# Altium footprint library 3.11-micro USB 、3.1 Type C接口.PcbLib: 28 footprints (part 1 of 2)
Each footprint in its own frame and in the unit in brackets; x right, y up, seen from the top. Pads: shape width x height; smd on the part's side, far side on the other; paste and mask are expansions set on the pad; w line width, h text height; cw(c..) or ccw(c..) is an arc to the next point about the centre after c.
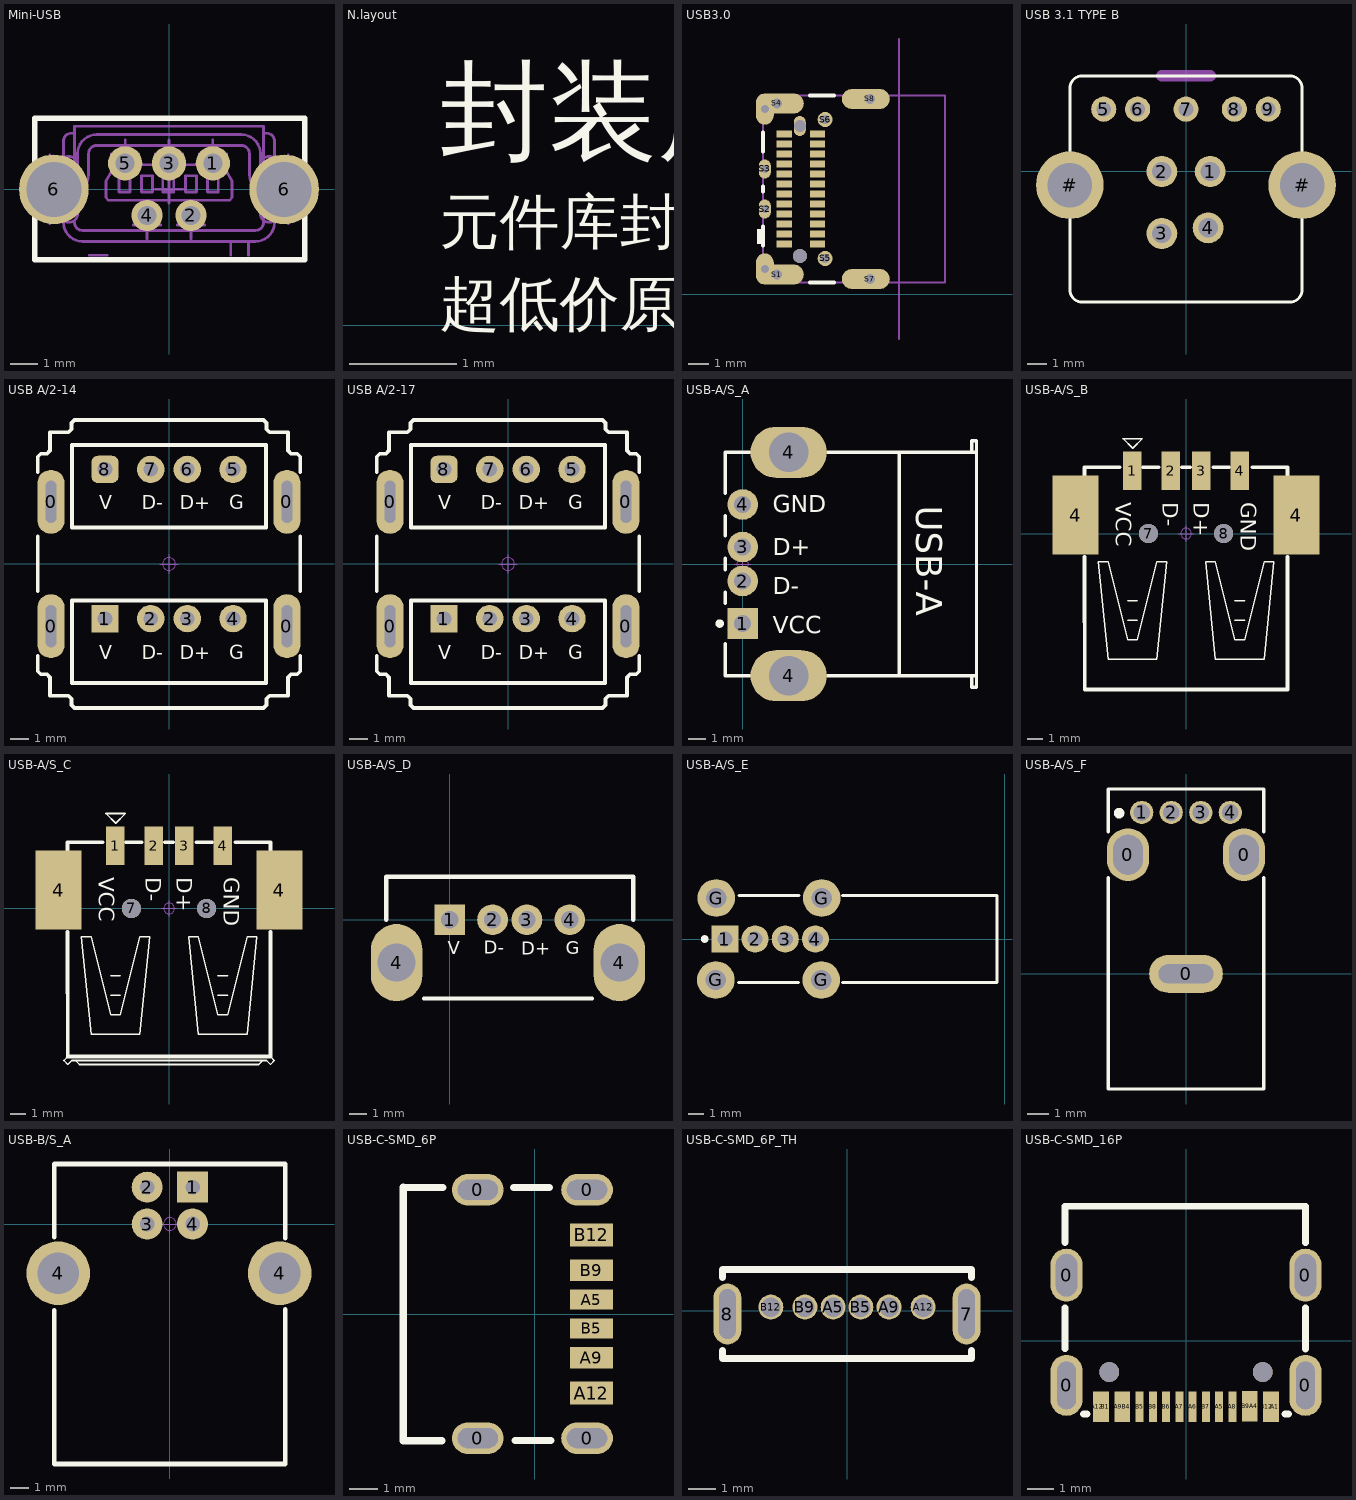
[diagram p0: the footprints below, top view; thin cyan lines are the x and y axes]

## Mini-USB [mm] "Straight, USB Serie Mini-B Type 2 Through Hole Receptacle"
height 7.7
pads (7):
  round 1.25 hole 0.7: 1(1.6,0.95) 3(0,0.95) 5(-1.6,0.95)
  round 1.143 hole 0.7: 2(0.8,-0.95) 4(-0.8,-0.95)
  round 2.54 hole 2.007: 6(-4.2,0) 6(4.2,0)
Top Overlay:
  lines w0.2: 1.4,0.5 1.8,0.5 ; -4.902,-2.565 -4.902,2.591 -3.031,2.591 4.953,2.591 4.953,-2.565 -4.902,-2.565
Mechanical 8:
  lines w0.1: -4.35,-1.25 -4.35,1.25 ; -4.15,0 -3.65,0 ; -3.65,-0.5 -3.65,0 ; -3.65,0.5 -3.65,0 ; -3.15,0 -3.65,0 ; -2.1,1.3 -1.6,1.3 ; -1.6,0.8 -1.6,1.3 ; -1.6,1.8 -1.6,1.3 ; -1.3,-1.3 -0.8,-1.3 ; -1.1,1.3 -1.6,1.3 ; -0.8,-1.8 -0.8,-1.3 ; -0.8,-0.8 -0.8,-1.3 ; -0.5,0 0,0 ; -0.5,1.3 0,1.3 ; -0.3,-1.3 -0.8,-1.3 ; 0,-0.5 0,0 ; 0,0.5 0,0 ; 0,0.8 0,1.3 ; 0,1.8 0,1.3 ; 0.3,-1.3 0.8,-1.3 ; 0.5,0 0,0 ; 0.5,1.3 0,1.3 ; 0.8,-1.8 0.8,-1.3 ; 0.8,-0.8 0.8,-1.3 ; 1.1,1.3 1.6,1.3 ; 1.3,-1.3 0.8,-1.3 ; 1.6,0.8 1.6,1.3 ; 1.6,1.8 1.6,1.3 ; 2.1,1.3 1.6,1.3 ; 3.15,0 3.65,0 ; 3.65,-0.5 3.65,0 ; 3.65,0.5 3.65,0 ; 4.15,0 3.65,0 ; 4.35,-1.25 4.35,1.25 ; -3.975,-0.875 ccw(c-3.65,-0.875) -3.325,-0.875 -3.325,0.875 ccw(c-3.65,0.875) -3.975,0.875 -3.975,-0.875 ; 3.325,-0.875 ccw(c3.65,-0.875) 3.975,-0.875 3.975,0.875 ccw(c3.65,0.875) 3.325,0.875 3.325,-0.875
Mechanical 14:
  lines w0.1: -3.45,-1.2 ccw(c-3.15,-1.2) -3.15,-1.5 3.15,-1.5 ccw(c3.15,-1.2) 3.45,-1.2 3.45,-0.403 ccw(c3.15,-0.403) 3.363,-0.192 3.138,0.035 cw(c3.635,0.528) 2.935,0.528 2.935,1.3 ccw(c2.635,1.3) 2.635,1.6 -2.635,1.6 ccw(c-2.635,1.3) -2.935,1.3 -2.935,0.528 cw(c-3.635,0.528) -3.138,0.035 -3.363,-0.192 ccw(c-3.15,-0.403) -3.45,-0.403 ; -3.45,0.288 -3.45,2.3 3.45,2.3 3.45,0.288 ; -3.45,2.05 -3.55,2.05 ccw(c-3.55,1.75) -3.85,1.75 -3.85,-0.403 ; -2.9,-2.4 -2.25,-2.4 ; 2.25,-2.4 2.25,-1.9 ; 2.9,-2.4 2.9,-1.9 ; 3.45,2.05 3.55,2.05 cw(c3.55,1.75) 3.85,1.75 3.85,-0.403 ; -3.85,-0.403 cw(c-3.15,-0.403) -3.647,0.089 -3.422,0.317 ccw(c-3.635,0.528) -3.335,0.528 -3.335,1.3 cw(c-2.635,1.3) -2.635,2 2.635,2 cw(c2.635,1.3) 3.335,1.3 3.335,0.528 ccw(c3.635,0.528) 3.422,0.317 3.647,0.089 cw(c3.15,-0.403) 3.85,-0.403 ; -3.85,-0.403 -3.85,-1.2 ccw(c-3.15,-1.2) -3.15,-1.9 3.15,-1.9 ccw(c3.15,-1.2) 3.85,-1.2 3.85,-0.403 ; 2.2,-0.4 2.3,-0.3 ; 2.2,-0.4 -2.2,-0.4 -2.3,-0.3 -2.3,0.3 -1.838,1.1 -1.318,1.1 -1.118,0.9 1.118,0.9 1.318,1.1 1.838,1.1 2.3,0.3 2.3,-0.3 ; 2.2,-0.4 2.3,-0.3 ; -1.825,-0.1 -1.425,-0.1 -1.425,0.5 -1.825,0.5 -1.825,-0.1 ; -1,-0.1 -0.6,-0.1 -0.6,0.5 -1,0.5 -1,-0.1 ; -0.225,-0.1 0.175,-0.1 0.175,0.5 -0.225,0.5 -0.225,-0.1 ; 0.6,-0.1 1,-0.1 1,0.5 0.6,0.5 0.6,-0.1 ; 1.4,-0.1 1.8,-0.1 1.8,0.5 1.4,0.5 1.4,-0.1
3D body: height 7.7, standoff -2.1, extent -3.85,-2.4 3.85,2.3

## N.layout [mm]
Top Overlay:
  text "封装库来自淘宝ID:黄晶宝石" at -5.715,1.397 h1.27
  text "超低价原理图设计、PCB代画，布局合理，走线规范" at -5.715,-0.127 h0.7
  text "元件库封装库制作https://shop463601444.taobao.com" at -5.715,0.635 h0.7

## USB3.0 [mm]
pads (42):
  rect 0.77x0.35 smd: A1(26.498,2.508) A2(26.498,3.008) A3(26.498,3.508) A4(26.498,4.008) A5(26.498,4.508) A6(26.498,5.008) A7(26.498,5.508) A8(26.498,6.008) A9(26.498,6.508) A10(26.498,7.008) A11(26.498,7.508) A12(26.498,8.008) B1(28.168,8.008) B2(28.168,7.508) B3(28.168,7.008) B4(28.168,6.508) B5(28.168,6.008) B6(28.168,5.508) B7(28.168,5.008) B8(28.168,4.508) B9(28.168,4.008) B10(28.168,3.508) B11(28.168,3.008) B12(28.168,2.508)
  round 0.7 hole 0.7 unplated mask+0: ALIGN1(27.283,1.908)
  oval 0.6x1 hole 0.6 unplated mask+0: ALIGN2(27.283,8.408)
  oval 1.6x0.5 hole 0.5 mask+0: S1(26.133,0.983) S4(26.133,9.533)
  oval 0.6x0.95 hole 0.4: S2(25.533,4.258) S3(25.533,6.258)
  round 0.75 hole 0.45: S5(28.553,1.783) S6(28.553,8.733)
  oval 1.5x0.5 hole 0.5 mask+0: S7(30.783,0.758) S8(30.783,9.758)
  oval 0.4x1.055 hole 0.4 mask+0: ""(25.533,1.26) ""(25.533,9.255)
  oval 0.9x1.555 all layers, no hole: ""(25.533,1.26) ""(25.533,9.255)
  oval 2.4x1 all layers, no hole: ""(26.283,0.983) ""(26.283,9.533) ""(30.583,0.758) ""(30.583,9.758)
Top Overlay:
  region: 25.433,2.508 25.433,3.258 25.133,3.258 25.133,2.508
  lines w0.2: 25.433,2.438 25.433,3.388 ; 25.433,5.128 25.433,5.388 ; 25.433,7.128 25.433,8.078 ; 27.79,0.583 29.003,0.583 ; 27.79,9.933 29.003,9.933
Mechanical 1:
  lines w0.1: 32.233,-2.242 32.233,12.758
Mechanical 5:
  lines w0.1: 25.433,0.583 34.533,0.583 34.533,9.933 25.433,9.933 25.433,0.583

## USB 3.1 TYPE B [mm] "USB 3.1  TYPE B"
height 16.2
pads (11):
  round 1.6 hole 1: 1(1.25,-0.01) 2(-1.25,-0.01) 3(-1.25,-3.21) 4(1.143,-2.921)
  round 1.3 hole 0.762: 5(-4.25,3.21) 6(-2.5,3.21) 7(0,3.21) 8(2.5,3.21) 9(4.25,3.21)
  round 3.5 hole 2.3: #(-6,-0.71) #(6,-0.71)
Top Overlay:
  lines w0.15: -6,-6.12 ccw(c-5.365,-6.12) -5.365,-6.755 5.365,-6.755 ccw(c5.365,-6.12) 6,-6.12 6,-0.71 6,4.294 ccw(c5.365,4.294) 5.365,4.929 -5.365,4.929 ccw(c-5.365,4.294) -6,4.294 -6,-0.71 -6,-6.12
Mechanical 1:
  lines w0.6: -1.25,4.929 1.25,4.929
3D body: height 16.2, standoff -3.25, extent -6.973,-7.443 6.973,5.157

## USB A/2-14 [mm] "双层USB母座高14.2mm"
pads (12):
  oval 1.5x3.5 hole 0.6 slot 2.3 at 90 deg: 0(-6.45,-3.4) 0(-6.45,3.4) 0(6.45,-3.4) 0(6.45,3.4)
  rect 1.5x1.5 hole 0.8: 1(-3.5,-2.985)
  round 1.5 hole 0.8: 2(-1,-2.985) 3(1,-2.985) 4(3.5,-2.985) 5(3.5,5.17) 6(1,5.17) 7(-1,5.17)
  rrect50% 1.5x1.5 hole 0.8: 8(-3.5,5.17)
Top Overlay:
  lines w0.203: -7.176,-5.024 -7.176,-5.863 -7.007,-6.031 -6.67,-6.031 -6.501,-6.2 -6.5,-6.199 -6.5,-7.199 -5.5,-7.199 -5.331,-7.369 -5.331,-7.706 -5.163,-7.875 5.162,-7.875 5.331,-7.706 5.331,-7.369 5.5,-7.2 6.5,-7.199 6.5,-6.199 6.501,-6.2 6.67,-6.031 7.007,-6.031 7.176,-5.863 7.176,-5.024 ; -7.176,-1.476 -7.176,1.524 ; -7.176,5.024 -7.176,5.862 -7.007,6.031 -6.67,6.031 -6.501,6.2 -6.5,6.199 -6.5,7.199 -5.5,7.199 ; -5.5,7.2 -5.331,7.369 -5.331,7.706 -5.163,7.875 5.162,7.875 5.331,7.706 5.331,7.369 5.5,7.2 6.5,7.199 6.5,6.199 6.501,6.2 6.67,6.031 7.007,6.031 7.176,5.863 7.176,5.024 ; 7.176,-1.476 7.176,1.524 ; -5.3,-6.5 5.3,-6.5 5.3,-2 -5.3,-2 -5.3,-6.5 ; -5.3,2 -5.3,6.5 5.3,6.5 5.3,2 -5.3,2
  text "V" at -3.812,-5.207 h0.76
  text "G" at 3.3,-5.2 h0.76
  text "D+" at 0.6,-5.2 h0.76
  text "D-" at -1.5,-5.2 h0.76
  text "D-" at -1.5,3 h0.76
  text "D+" at 0.6,3 h0.76
  text "G" at 3.3,3 h0.76
  text "V" at -3.812,2.993 h0.76
Mechanical 15:
  circle w0.05: c0,0 r0.35
  lines w0.05: -0.5,0 0.5,0 ; 0,-0.5 0,0.5
3D body: height 3.52, standoff -14.77, extent -7.927,-7.8 7.927,7.8

## USB A/2-17 [mm] "双层USB母座高16.7mm              淘宝ID:黄晶宝石"
pads (12):
  oval 1.5x3.5 hole 0.6 slot 2.3 at 90 deg: 0(-6.45,-3.4) 0(-6.45,3.4) 0(6.45,-3.4) 0(6.45,3.4)
  rect 1.5x1.5 hole 0.8: 1(-3.5,-2.985)
  round 1.5 hole 0.8: 2(-1,-2.985) 3(1,-2.985) 4(3.5,-2.985) 5(3.5,5.17) 6(1,5.17) 7(-1,5.17)
  rrect50% 1.5x1.5 hole 0.8: 8(-3.5,5.17)
Top Overlay:
  lines w0.203: -7.176,-5.024 -7.176,-5.863 -7.007,-6.031 -6.67,-6.031 -6.501,-6.2 -6.5,-6.199 -6.5,-7.199 -5.5,-7.199 -5.331,-7.369 -5.331,-7.706 -5.163,-7.875 5.162,-7.875 5.331,-7.706 5.331,-7.369 5.5,-7.2 6.5,-7.199 6.5,-6.199 6.501,-6.2 6.67,-6.031 7.007,-6.031 7.176,-5.863 7.176,-5.024 ; -7.176,-1.476 -7.176,1.524 ; -7.176,5.024 -7.176,5.862 -7.007,6.031 -6.67,6.031 -6.501,6.2 -6.5,6.199 -6.5,7.199 -5.5,7.199 ; -5.5,7.2 -5.331,7.369 -5.331,7.706 -5.163,7.875 5.162,7.875 5.331,7.706 5.331,7.369 5.5,7.2 6.5,7.199 6.5,6.199 6.501,6.2 6.67,6.031 7.007,6.031 7.176,5.863 7.176,5.024 ; 7.176,-1.476 7.176,1.524 ; -5.3,-6.5 5.3,-6.5 5.3,-2 -5.3,-2 -5.3,-6.5 ; -5.3,2 -5.3,6.5 5.3,6.5 5.3,2 -5.3,2
  text "V" at -3.812,-5.207 h0.76
  text "G" at 3.3,-5.2 h0.76
  text "D+" at 0.6,-5.2 h0.76
  text "D-" at -1.5,-5.2 h0.76
  text "D-" at -1.5,3 h0.76
  text "D+" at 0.6,3 h0.76
  text "G" at 3.3,3 h0.76
  text "V" at -3.812,2.993 h0.76
Mechanical 15:
  circle w0.05: c0,0 r0.35
  lines w0.05: -0.5,0 0.5,0 ; 0,-0.5 0,0.5
3D body: height 3.52, standoff -17.26, extent -7.927,-7.8 7.927,7.8

## USB-A/S_A [mm] "A型直插母头， 淘宝ID:黄晶宝石"
height 7.01
pads (6):
  rect 1.8x1.8 hole 1: 1(0,-3.5)
  round 1.8 hole 1: 2(0,-1) 3(0,1) 4(0,3.5)
  oval 4.5x3 hole 2.3: 4(2.71,-6.57) 4(2.71,6.57)
Top Overlay:
  circle w0.25: c-1.35,-3.5 r0.125
  lines w0.2: -1.01,-4.7 -1.01,-6.565 0.41,-6.565 ; -1.01,-2.3 -1.01,-1.66 ; -1.01,-0.34 -1.01,0.34 ; -1.01,1.66 -1.01,2.84 ; -1.01,4.16 -1.01,6.565 0.41,6.565 ; 5.01,-6.565 13.752,-6.565 ; 5.01,6.565 13.752,6.565 ; 13.462,-6.565 13.462,-7.25 13.752,-7.25 13.752,7.25 13.462,7.25 13.462,6.565
  lines w0.203: 9.21,-6.565 9.21,6.565
  text "GND" at 1.778,3.048 h1.02
  text "D+" at 1.778,0.508 h1.02
  text "D-" at 1.778,-1.778 h1.02
  text "VCC" at 1.778,-4.064 h1.02
  text "USB-A" at 10.21,3.43 h1.52
Mechanical 15:
  circle w0.05: c0,0 r0.35
  lines w0.05: -0.5,0 0.5,0 ; 0,-0.5 0,0.5
3D body: height 6.8, standoff -4.31, extent -0.605,-7.342 13.7,7.343

## USB-A/S_B [mm] "A型贴片母头，"
pads (8):
  rect 1.2x2.5 smd: 1(-3.5,4.1) 2(-1,4.1) 3(1,4.1) 4(3.5,4.1)
  rect 3x5.15 smd: 4(-7.2,1.2) 4(7.2,1.2)
  round 1.25 hole 1.25 unplated: 7(-2.45,0) 8(2.45,0)
Top Overlay:
  lines w0.1: -3.803,-5.649 -3.168,-5.649 ; -3.803,-4.379 -3.168,-4.379 ; 3.182,-5.649 3.817,-5.649 ; 3.182,-4.379 3.817,-4.379 ; -5.708,-1.839 -5.073,-1.839 -3.803,-6.919 -3.168,-6.919 -1.898,-1.839 -1.263,-1.839 -1.898,-8.189 -5.073,-8.189 -5.708,-1.839 ; -4.113,6.19 -2.843,6.19 -3.478,5.555 -4.113,6.19 ; 1.277,-1.839 1.912,-1.839 3.182,-6.919 3.817,-6.919 5.087,-1.839 5.722,-1.839 5.087,-8.189 1.912,-8.189 1.277,-1.839
  lines w0.254: -6.604,-1.524 -6.597,-10.16 6.611,-10.16 6.604,-1.524 ; -6.604,3.81 -6.604,4.318 -4.318,4.318 ; -2.794,4.318 -1.778,4.318 ; -0.254,4.318 0.254,4.318 ; 1.778,4.318 2.794,4.318 ; 4.318,4.318 6.611,4.318 6.604,3.81
  text "VCC" at -4.572,2.032 h1.02
  text "D-" at -1.524,2.032 h1.02
  text "D+" at 0.508,2.032 h1.02
  text "GND" at 3.556,2.032 h1.02
Mechanical 15:
  circle w0.05: c0,0 r0.35
  lines w0.05: -0.5,0 0.5,0 ; 0,-0.5 0,0.5
3D body: height 6.9, standoff -0.55, extent -7.75,-9.9 7.75,4.8

## USB-A/S_C [mm] "A型贴片母头， 淘宝ID:黄晶宝石"
pads (8):
  rect 1.2x2.5 smd: 1(-3.5,4.1) 2(-1,4.1) 3(1,4.1) 4(3.5,4.1)
  rect 3x5.15 smd: 4(-7.2,1.2) 4(7.2,1.2)
  round 1.25 hole 1.25 unplated: 7(-2.45,0) 8(2.45,0)
Top Overlay:
  lines w0.1: -6.597,-9.652 -6.851,-9.906 -6.597,-10.16 -6.343,-9.906 -6.089,-9.906 ; -3.803,-5.649 -3.168,-5.649 ; -3.803,-4.379 -3.168,-4.379 ; 3.182,-5.649 3.817,-5.649 ; 3.182,-4.379 3.817,-4.379 ; 6.611,-9.652 6.865,-9.906 6.611,-10.16 6.357,-9.906 6.103,-9.906 ; -6.089,-9.906 6.103,-9.906 ; -6.089,-9.906 -5.835,-10.166 5.849,-10.166 6.103,-9.906 ; -5.708,-1.839 -5.073,-1.839 -3.803,-6.919 -3.168,-6.919 -1.898,-1.839 -1.263,-1.839 -1.898,-8.189 -5.073,-8.189 -5.708,-1.839 ; -4.113,6.19 -2.843,6.19 -3.478,5.555 -4.113,6.19 ; 1.277,-1.839 1.912,-1.839 3.182,-6.919 3.817,-6.919 5.087,-1.839 5.722,-1.839 5.087,-8.189 1.912,-8.189 1.277,-1.839
  lines w0.254: -6.604,-1.524 -6.597,-9.652 ; -6.604,3.81 -6.604,4.318 -4.318,4.318 ; -6.597,-9.652 6.611,-9.652 ; -2.794,4.318 -1.778,4.318 ; -0.254,4.318 0.254,4.318 ; 1.778,4.318 2.794,4.318 ; 4.318,4.318 6.611,4.318 6.604,3.81 ; 6.604,-1.524 6.611,-9.652
  text "VCC" at -4.572,2.032 h1.02
  text "D-" at -1.524,2.032 h1.02
  text "D+" at 0.508,2.032 h1.02
  text "GND" at 3.556,2.032 h1.02
Mechanical 15:
  circle w0.05: c0,0 r0.35
  lines w0.05: -0.5,0 0.5,0 ; 0,-0.5 0,0.5
3D body: height 7.4, standoff -0.55, extent -7.75,-9.9 7.75,4.8

## USB-A/S_D [mm] "A型直插母头，"
pads (6):
  rect 1.8x1.8 hole 1: 1(0,0)
  round 1.8 hole 1: 2(2.5,0) 3(4.5,0) 4(7,0)
  oval 3x4.5 hole 2.2: 4(-3.1,-2.5) 4(9.9,-2.5)
Top Overlay:
  lines w0.254: -3.7,0 -3.7,2.5 10.7,2.5 10.7,0 ; -1.5,-4.6 8.3,-4.6
  text "D-" at 1.996,-1.981 h0.76
  text "D+" at 4.181,-2.032 h0.76
  text "G" at 6.771,-2.007 h0.76
  text "V" at -0.112,-2.007 h0.76
3D body: height 14, standoff -4, extent -3.705,-4.599 10.695,2.501

## USB-A/S_E [mm] "A型直插母头，"
pads (8):
  rect 1.8x1.8 hole 1: 1(-18.56,0)
  round 1.8 hole 1: 2(-16.56,0) 3(-14.56,0) 4(-12.56,0)
  round 2.5 hole 1.35: G(-19.167,-2.718) G(-19.141,2.718) G(-12.167,-2.718) G(-12.141,2.718)
Top Overlay:
  circle w0.25: c-19.91,0 r0.125
  lines w0.2: -17.65,-2.878 -13.684,-2.878 ; -17.624,2.878 -13.658,2.878 ; -10.773,-2.88 -0.508,-2.88 -0.508,2.88 -10.773,2.88
3D body: height 14.45, standoff -3.69, extent -19.725,-3.606 -0.475,3.644

## USB-A/S_F [mm] "A型侧插短体无卷边 90度母座"
pads (7):
  oval 2x2.5 hole 1.4 slot 1.9 at 90 deg: 0(-2.75,5.65) 0(2.75,5.65)
  oval 3.5x1.8 hole 0.9 slot 2.6 at 0 deg: 0(0,0)
  round 1.1 hole 0.8: 1(-2.1,7.65) 2(-0.7,7.65) 3(0.7,7.65) 4(2.1,7.65)
Top Overlay:
  circle w0.25: c-3.173,7.62 r0.125
  lines w0.152: -3.683,4.572 -3.683,-5.461 3.683,-5.461 3.683,4.572 ; -3.683,6.731 -3.683,8.763 3.683,8.763 3.683,6.731
3D body: height 13.7, standoff -3.05, extent -3.56,-5.35 3.56,8.65

## USB-B/S_A [mm] "b型USB 母座 16.3*13.7*11mm"
height 1.1
pads (6):
  rect 1.7x1.7 hole 0.8: 1(1.25,2.032)
  round 1.7 hole 0.8: 2(-1.25,2.032) 3(-1.25,0) 4(1.25,0)
  round 3.5 hole 2.3: 4(-6.141,-2.71) 4(6.051,-2.71)
Top Overlay:
  lines w0.254: -6.35,-4.737 -6.35,-13.208 6.35,-13.208 6.35,-4.686 ; -6.35,-0.724 -6.35,3.302 6.35,3.302 6.35,-0.775
Mechanical 15:
  circle w0.05: c0,0 r0.35
  lines w0.05: -0.5,0 0.5,0 ; 0,-0.5 0,0.5
3D body: height 11.45, standoff -2.95, extent -6.859,-13.16 6.86,3.14

## USB-C-SMD_6P [mil] "封装库来自淘宝ID:黄晶宝石"
pads (10):
  oval 70.82x43.31 hole 27.56 slot 55.16 at 0 deg: 0(-77.75,-170.08) 0(-77.75,170.08) 0(71.84,-170.08) 0(71.84,170.08)
  rect 59x27.6 smd: A5(77.76,19.7) B5(77.76,-19.7)
  rect 59x29.9 smd: A9(77.76,-59.85) B9(77.76,59.85)
  rect 59x31.5 smd: A12(77.76,-108.25) B12(77.76,108.25)
Top Overlay:
  lines w10: -180.15,-173.6 -126.94,-173.6 ; -180.12,-173.62 -180.12,173.62 ; -180.12,173.23 -125.79,173.23 ; -28.54,173.23 20.27,173.23 ; -26.65,-173.23 22.16,-173.23
3D body: height 126.77, standoff -37.01, extent -172.37,-175.98 95.35,175.98

## USB-C-SMD_6P_TH [mm] "封装库来自淘宝ID:黄晶宝石"
pads (8):
  oval 1x2.199 hole 0.6 slot 1.8 at 90 deg: 7(4.32,-0.125) 8(-4.32,-0.125)
  round 0.9 hole 0.7: A5(-0.5,0.125) A9(1.52,0.125) A12(2.75,0.125) B5(0.5,0.125) B9(-1.52,0.125) B12(-2.75,0.125)
Top Overlay:
  lines w0.254: -4.5,-1.445 -4.5,-1.725 4.5,-1.725 4.5,-1.445 ; -4.5,1.195 -4.5,1.475 4.445,1.475 ; 4.5,1.195 4.5,1.475
3D body: height 6.76, standoff -0.94, extent -4.47,-1.58 4.47,1.602

## USB-C-SMD_16P [mm] "封装库来自淘宝ID:黄晶宝石"
pads (22):
  oval 1.2x2.3 hole 0.7 slot 1.8 at 90 deg: 0(-4.5,-1.675) 0(4.5,-1.675)
  oval 1.2x2 hole 0.8 slot 1.6 at 90 deg: 0(-4.5,2.475) 0(4.5,2.475)
  rect 0.3x1.15 smd: A1(3.35,-2.473) A4(2.55,-2.471) A5(1.25,-2.475) A6(0.25,-2.475) A7(-0.25,-2.473) A9(-2.55,-2.475) A12(-3.35,-2.475) B1(-3.05,-2.475) B4(-2.25,-2.475) B5(-1.75,-2.475) B6(-0.75,-2.475) B7(0.75,-2.473) B9(2.25,-2.471) B12(3.05,-2.473)
  rect 0.3x1.148 smd: A8(1.75,-2.475) B8(-1.25,-2.475)
  round 0.75 hole 0.75 unplated: ""(-2.89,-1.175) ""(2.89,-1.175)
Top Overlay:
  lines w0.254: -4.557,-0.296 -4.557,1.246 ; -4.557,3.704 -4.557,5.075 4.5,5.075 4.5,3.698 ; -3.856,-2.75 -3.819,-2.75 -3.731,-2.75 ; 3.731,-2.75 3.856,-2.75 ; 4.5,-0.302 4.5,1.252
3D body: height 3.25, standoff -0.85, extent -4.445,-2.875 4.495,5.025